# Altium footprint library Library.PcbLib: 224 footprints (part 9 of 16)
Each footprint in its own frame and in the unit in brackets; x right, y up, seen from the top. Pads: shape width x height; smd on the part's side, far side on the other; paste and mask are expansions set on the pad; w line width, h text height; cw(c..) or ccw(c..) is an arc to the next point about the centre after c.
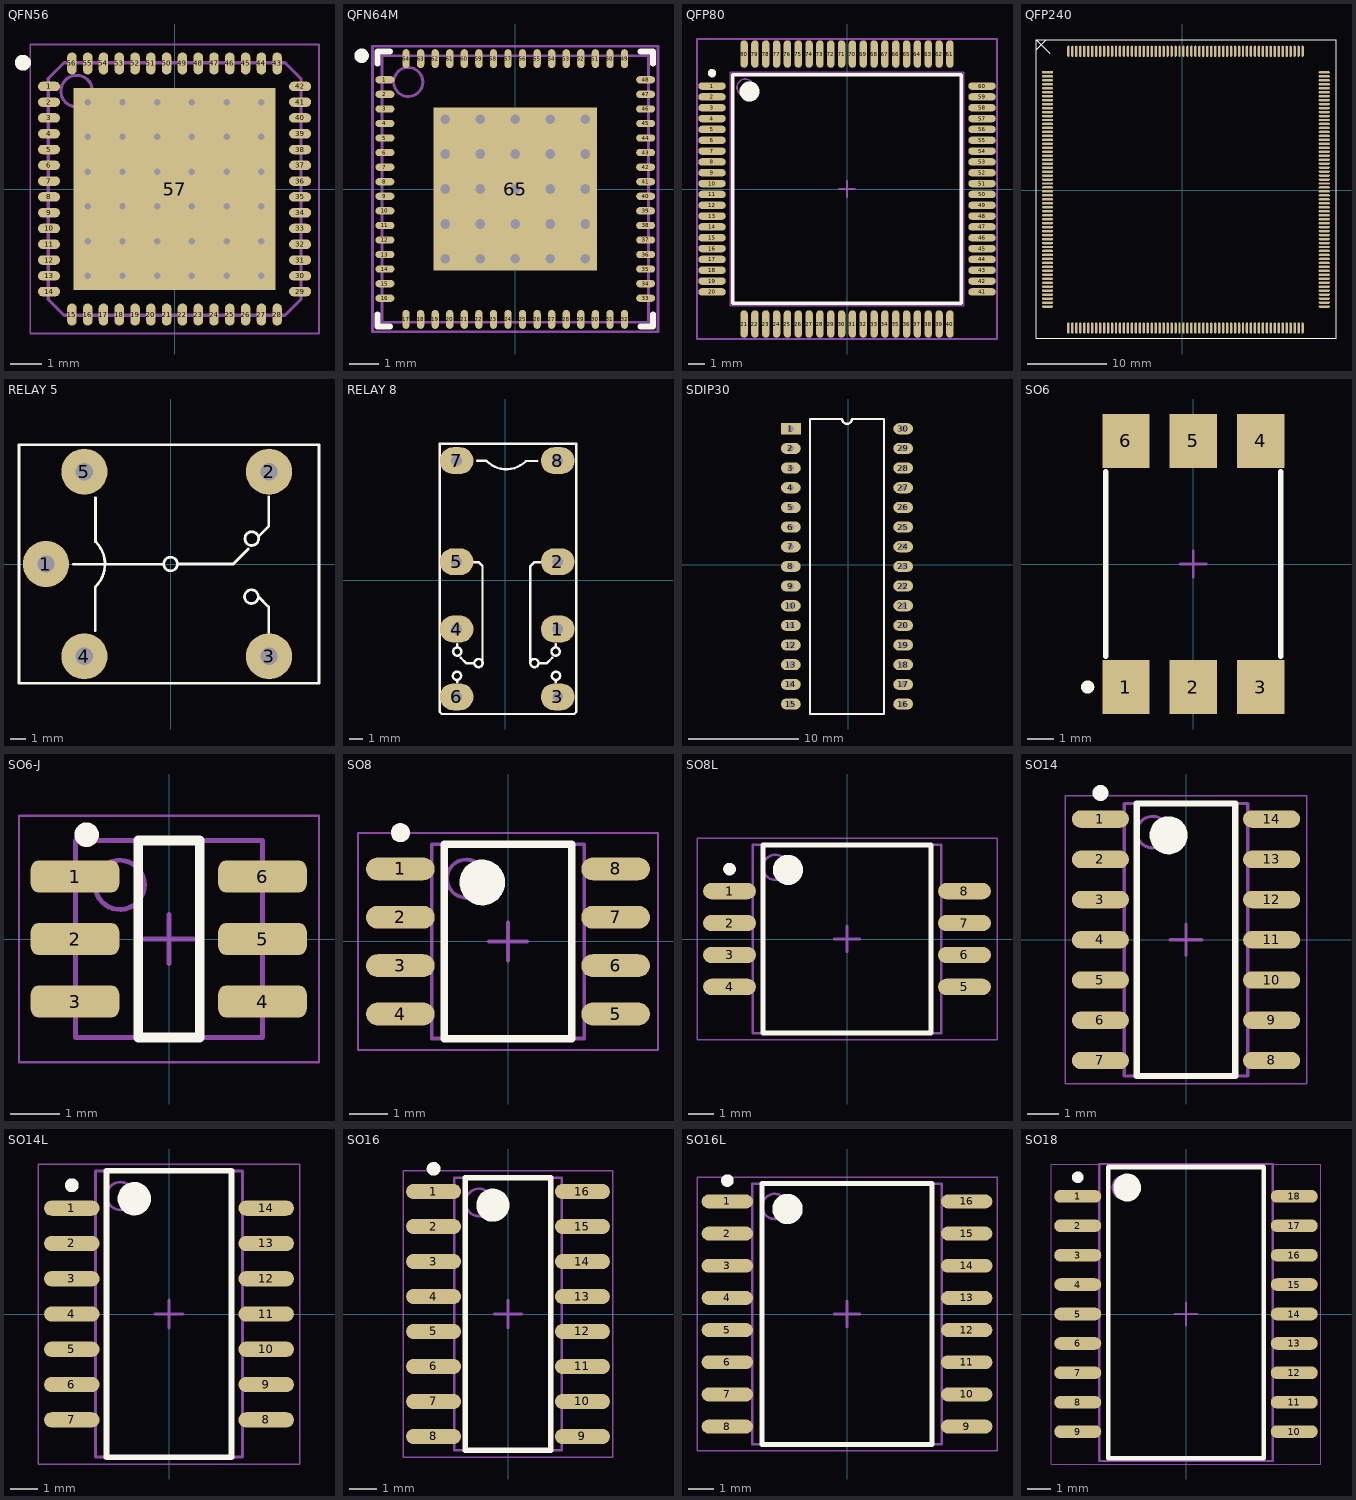
[diagram p8: the footprints below, top view; thin cyan lines are the x and y axes]

## QFN56 [mm] "QFN, 56-Leads, Body 8.00x8.00mm, Pitch 0.50mm, Thermal Pad 6.40x6.40mm, IPC Medium Density"
height 1
pads (57):
  oval 0.7x0.3 smd: 1(-3.975,3.25) 2(-3.975,2.75) 3(-3.975,2.25) 4(-3.975,1.75) 5(-3.975,1.25) 6(-3.975,0.75) 7(-3.975,0.25) 8(-3.975,-0.25) 9(-3.975,-0.75) 10(-3.975,-1.25) 11(-3.975,-1.75) 12(-3.975,-2.25) 13(-3.975,-2.75) 14(-3.975,-3.25) 29(3.975,-3.25) 30(3.975,-2.75) 31(3.975,-2.25) 32(3.975,-1.75) 33(3.975,-1.25) 34(3.975,-0.75) 35(3.975,-0.25) 36(3.975,0.25) 37(3.975,0.75) 38(3.975,1.25) 39(3.975,1.75) 40(3.975,2.25) 41(3.975,2.75) 42(3.975,3.25)
  oval 0.3x0.7 smd: 15(-3.25,-3.975) 16(-2.75,-3.975) 17(-2.25,-3.975) 18(-1.75,-3.975) 19(-1.25,-3.975) 20(-0.75,-3.975) 21(-0.25,-3.975) 22(0.25,-3.975) 23(0.75,-3.975) 24(1.25,-3.975) 25(1.75,-3.975) 26(2.25,-3.975) 27(2.75,-3.975) 28(3.25,-3.975) 43(3.25,3.975) 44(2.75,3.975) 45(2.25,3.975) 46(1.75,3.975) 47(1.25,3.975) 48(0.75,3.975) 49(0.25,3.975) 50(-0.25,3.975) 51(-0.75,3.975) 52(-1.25,3.975) 53(-1.75,3.975) 54(-2.25,3.975) 55(-2.75,3.975) 56(-3.25,3.975)
  rect 6.4x6.4 smd: 57(0,0)
via 2.75,-2.75 diameter 0.5 hole 0.2
via 1.65,-2.75 diameter 0.5 hole 0.2
via 0.55,-2.75 diameter 0.5 hole 0.2
via -0.55,-2.75 diameter 0.5 hole 0.2
via -1.65,-2.75 diameter 0.5 hole 0.2
via -2.75,-2.75 diameter 0.5 hole 0.2
via 2.75,-1.65 diameter 0.5 hole 0.2
via 1.65,-1.65 diameter 0.5 hole 0.2
via 0.55,-1.65 diameter 0.5 hole 0.2
via -0.55,-1.65 diameter 0.5 hole 0.2
via -1.65,-1.65 diameter 0.5 hole 0.2
via -2.75,-1.65 diameter 0.5 hole 0.2
via 2.75,-0.55 diameter 0.5 hole 0.2
via 1.65,-0.55 diameter 0.5 hole 0.2
via 0.55,-0.55 diameter 0.5 hole 0.2
via -0.55,-0.55 diameter 0.5 hole 0.2
via -1.65,-0.55 diameter 0.5 hole 0.2
via -2.75,-0.55 diameter 0.5 hole 0.2
via 2.75,0.55 diameter 0.5 hole 0.2
via 1.65,0.55 diameter 0.5 hole 0.2
via 0.55,0.55 diameter 0.5 hole 0.2
via -0.55,0.55 diameter 0.5 hole 0.2
via -1.65,0.55 diameter 0.5 hole 0.2
via -2.75,0.55 diameter 0.5 hole 0.2
via 2.75,1.65 diameter 0.5 hole 0.2
via 1.65,1.65 diameter 0.5 hole 0.2
via 0.55,1.65 diameter 0.5 hole 0.2
via -0.55,1.65 diameter 0.5 hole 0.2
via -1.65,1.65 diameter 0.5 hole 0.2
via -2.75,1.65 diameter 0.5 hole 0.2
via 2.75,2.75 diameter 0.5 hole 0.2
via 1.65,2.75 diameter 0.5 hole 0.2
via 0.55,2.75 diameter 0.5 hole 0.2
via -0.55,2.75 diameter 0.5 hole 0.2
via -1.65,2.75 diameter 0.5 hole 0.2
via -2.75,2.75 diameter 0.5 hole 0.2
Top Overlay:
  circle w0.25: c-4.8,4 r0.125
Mechanical 13:
  circle w0.1: c-3.1,3.1 r0.5
  lines w0.1: -4,-3.5 -4,3.5 -3.5,4 3.5,4 4,3.5 4,-3.5 3.5,-4 -3.5,-4 -4,-3.5
Mechanical 15:
  lines w0.05: -4.575,-4.575 4.575,-4.575 4.575,4.575 -4.575,4.575 -4.575,-4.575
  lines w0.1: -0.5,0 0.5,0 ; 0,-0.5 0,0.5
3D body "User Library-QFN56 (8x8).step": height 0.95, standoff 0, extent -4.015,-4.015 4.015,4.015

## QFN64M [mm] "QFN, 64-Leads, Body 9x9mm, Pitch 0.5mm, IPC High Density"
height 1
pads (65):
  oval 0.65x0.25 smd: 1(-4.475,3.75) 2(-4.475,3.25) 3(-4.475,2.75) 4(-4.475,2.25) 5(-4.475,1.75) 6(-4.475,1.25) 7(-4.475,0.75) 8(-4.475,0.25) 9(-4.475,-0.25) 10(-4.475,-0.75) 11(-4.475,-1.25) 12(-4.475,-1.75) 13(-4.475,-2.25) 14(-4.475,-2.75) 15(-4.475,-3.25) 16(-4.475,-3.75) 33(4.475,-3.75) 34(4.475,-3.25) 35(4.475,-2.75) 36(4.475,-2.25) 37(4.475,-1.75) 38(4.475,-1.25) 39(4.475,-0.75) 40(4.475,-0.25) 41(4.475,0.25) 42(4.475,0.75) 43(4.475,1.25) 44(4.475,1.75) 45(4.475,2.25) 46(4.475,2.75) 47(4.475,3.25) 48(4.475,3.75)
  oval 0.25x0.65 smd: 17(-3.75,-4.475) 18(-3.25,-4.475) 19(-2.75,-4.475) 20(-2.25,-4.475) 21(-1.75,-4.475) 22(-1.25,-4.475) 23(-0.75,-4.475) 24(-0.25,-4.475) 25(0.25,-4.475) 26(0.75,-4.475) 27(1.25,-4.475) 28(1.75,-4.475) 29(2.25,-4.475) 30(2.75,-4.475) 31(3.25,-4.475) 32(3.75,-4.475) 49(3.75,4.475) 50(3.25,4.475) 51(2.75,4.475) 52(2.25,4.475) 53(1.75,4.475) 54(1.25,4.475) 55(0.75,4.475) 56(0.25,4.475) 57(-0.25,4.475) 58(-0.75,4.475) 59(-1.25,4.475) 60(-1.75,4.475) 61(-2.25,4.475) 62(-2.75,4.475) 63(-3.25,4.475) 64(-3.75,4.475)
  rect 5.6x5.6 smd: 65(0,0)
via -2.4,2.4 diameter 0.66 hole 0.33
via -1.2,2.4 diameter 0.66 hole 0.33
via 0,2.4 diameter 0.66 hole 0.33
via 1.2,2.4 diameter 0.66 hole 0.33
via 2.4,2.4 diameter 0.66 hole 0.33
via -2.4,1.2 diameter 0.66 hole 0.33
via -1.2,1.2 diameter 0.66 hole 0.33
via 0,1.2 diameter 0.66 hole 0.33
via 1.2,1.2 diameter 0.66 hole 0.33
via 2.4,1.2 diameter 0.66 hole 0.33
via -2.4,0 diameter 0.66 hole 0.33
via -1.2,0 diameter 0.66 hole 0.33
via 0,0 diameter 0.66 hole 0.33
via 1.2,0 diameter 0.66 hole 0.33
via 2.4,0 diameter 0.66 hole 0.33
via -2.4,-1.2 diameter 0.66 hole 0.33
via -1.2,-1.2 diameter 0.66 hole 0.33
via 0,-1.2 diameter 0.66 hole 0.33
via 1.2,-1.2 diameter 0.66 hole 0.33
via 2.4,-1.2 diameter 0.66 hole 0.33
via -2.4,-2.4 diameter 0.66 hole 0.33
via -1.2,-2.4 diameter 0.66 hole 0.33
via 0,-2.4 diameter 0.66 hole 0.33
via 1.2,-2.4 diameter 0.66 hole 0.33
via 2.4,-2.4 diameter 0.66 hole 0.33
Top Overlay:
  circle w0.25: c-5.275,4.575 r0.125
  lines w0.2: -4.725,-4.3 -4.725,-4.725 -4.3,-4.725 ; -4.725,4.3 -4.725,4.725 -4.3,4.725 ; 4.3,-4.725 4.725,-4.725 4.725,-4.3 ; 4.3,4.725 4.725,4.725 4.725,4.3
Mechanical 13:
  circle w0.1: c-3.675,3.675 r0.5
  lines w0.1: -4.575,-4.575 -4.575,4.575 4.575,4.575 4.575,-4.575 -4.575,-4.575
Mechanical 15:
  lines w0.1: -0.5,0 0.5,0 ; 0,-0.5 0,0.5 ; -4.9,-4.9 -4.9,4.9 4.9,4.9 4.9,-4.9 -4.9,-4.9
3D body "User Library-SiLabs QFN64 (9x9).step": height 0.9, standoff 0, extent -4.5,-4.5 4.5,4.5

## QFP80 [mm] "QFP, 80-Leads, Body 14 x 14mm, Pitch 0.65mm, IPC High Density"
height 2.45
pads (80):
  oval 1.65x0.45 smd: 1(-8.1,6.175) 2(-8.1,5.525) 3(-8.1,4.875) 4(-8.1,4.225) 5(-8.1,3.575) 6(-8.1,2.925) 7(-8.1,2.275) 8(-8.1,1.625) 9(-8.1,0.975) 10(-8.1,0.325) 11(-8.1,-0.325) 12(-8.1,-0.975) 13(-8.1,-1.625) 14(-8.1,-2.275) 15(-8.1,-2.925) 16(-8.1,-3.575) 17(-8.1,-4.225) 18(-8.1,-4.875) 19(-8.1,-5.525) 20(-8.1,-6.175) 41(8.1,-6.175) 42(8.1,-5.525) 43(8.1,-4.875) 44(8.1,-4.225) 45(8.1,-3.575) 46(8.1,-2.925) 47(8.1,-2.275) 48(8.1,-1.625) 49(8.1,-0.975) 50(8.1,-0.325) 51(8.1,0.325) 52(8.1,0.975) 53(8.1,1.625) 54(8.1,2.275) 55(8.1,2.925) 56(8.1,3.575) 57(8.1,4.225) 58(8.1,4.875) 59(8.1,5.525) 60(8.1,6.175)
  oval 0.45x1.65 smd: 21(-6.175,-8.1) 22(-5.525,-8.1) 23(-4.875,-8.1) 24(-4.225,-8.1) 25(-3.575,-8.1) 26(-2.925,-8.1) 27(-2.275,-8.1) 28(-1.625,-8.1) 29(-0.975,-8.1) 30(-0.325,-8.1) 31(0.325,-8.1) 32(0.975,-8.1) 33(1.625,-8.1) 34(2.275,-8.1) 35(2.925,-8.1) 36(3.575,-8.1) 37(4.225,-8.1) 38(4.875,-8.1) 39(5.525,-8.1) 40(6.175,-8.1) 61(6.175,8.1) 62(5.525,8.1) 63(4.875,8.1) 64(4.225,8.1) 65(3.575,8.1) 66(2.925,8.1) 67(2.275,8.1) 68(1.625,8.1) 69(0.975,8.1) 70(0.325,8.1) 71(-0.325,8.1) 72(-0.975,8.1) 73(-1.625,8.1) 74(-2.275,8.1) 75(-2.925,8.1) 76(-3.575,8.1) 77(-4.225,8.1) 78(-4.875,8.1) 79(-5.525,8.1) 80(-6.175,8.1)
Top Overlay:
  circle w0.25: c-8.1,6.95 r0.125
  circle w0.6: c-5.85,5.85 r0.3
  lines w0.2: -6.85,-6.85 -6.85,6.85 6.85,6.85 6.85,-6.85 -6.85,-6.85
Mechanical 13:
  circle w0.1: c-6.1,6.1 r0.5
  lines w0.1: -7,-7 -7,7 7,7 7,-7 -7,-7
Mechanical 15:
  lines w0.1: -0.5,0 0.5,0 ; 0,-0.5 0,0.5 ; -9,-9 -9,9 9,9 9,-9 -9,-9
3D body "User Library-IPC QFP-full.step": height 1.35, standoff 0, extent -8.018,-8.018 8.018,8.018

## QFP240 [mm]
pads (240):
  rect 1.4x0.31 smd: 1(-16.993,14.859)
  oval 1.4x0.31 smd: 2(-16.993,14.359) 3(-16.993,13.859) 4(-16.993,13.359) 5(-16.993,12.859) 6(-16.993,12.359) 7(-16.993,11.859) 8(-16.993,11.359) 9(-16.993,10.859) 10(-16.993,10.359) 11(-16.993,9.859) 12(-16.993,9.359) 13(-16.993,8.859) 14(-16.993,8.359) 15(-16.993,7.859) 16(-16.993,7.359) 17(-16.993,6.859) 18(-16.993,6.359) 19(-16.993,5.859) 20(-16.993,5.359) 21(-16.993,4.859) 22(-16.993,4.359) 23(-16.993,3.859) 24(-16.993,3.359) 25(-16.993,2.859) 26(-16.993,2.359) 27(-16.993,1.859) 28(-16.993,1.359) 29(-16.993,0.859) 30(-16.993,0.359) 31(-16.993,-0.141) 32(-16.993,-0.641) 33(-16.993,-1.141) 34(-16.993,-1.641) 35(-16.993,-2.141) 36(-16.993,-2.641) 37(-16.993,-3.141) 38(-16.993,-3.641) 39(-16.993,-4.141) 40(-16.993,-4.641) 41(-16.993,-5.141) 42(-16.993,-5.641) 43(-16.993,-6.141) 44(-16.993,-6.641) 45(-16.993,-7.141) 46(-16.993,-7.641) 47(-16.993,-8.141) 48(-16.993,-8.641) 49(-16.993,-9.141) 50(-16.993,-9.641) 51(-16.993,-10.141) 52(-16.993,-10.641) 53(-16.993,-11.141) 54(-16.993,-11.641) 55(-16.993,-12.141) 56(-16.993,-12.641) 57(-16.993,-13.141) 58(-16.993,-13.641) 59(-16.993,-14.141) 60(-16.993,-14.641) 121(17.872,-14.641) 122(17.872,-14.141) 123(17.872,-13.641) 124(17.872,-13.141) 125(17.872,-12.641) 126(17.872,-12.141) 127(17.872,-11.641) 128(17.872,-11.141) 129(17.872,-10.641) 130(17.872,-10.141) 131(17.872,-9.641) 132(17.872,-9.141) 133(17.872,-8.641) 134(17.872,-8.141) 135(17.872,-7.641) 136(17.872,-7.141) 137(17.872,-6.641) 138(17.872,-6.141) 139(17.872,-5.641) 140(17.872,-5.141) 141(17.872,-4.641) 142(17.872,-4.141) 143(17.872,-3.641) 144(17.872,-3.141) 145(17.872,-2.641) 146(17.872,-2.141) 147(17.872,-1.641) 148(17.872,-1.141) 149(17.872,-0.641) 150(17.872,-0.141) 151(17.872,0.359) 152(17.872,0.859) 153(17.872,1.359) 154(17.872,1.859) 155(17.872,2.359) 156(17.872,2.859) 157(17.872,3.359) 158(17.872,3.859) 159(17.872,4.359) 160(17.872,4.859) 161(17.872,5.359) 162(17.872,5.859) 163(17.872,6.359) 164(17.872,6.859) 165(17.872,7.359) 166(17.872,7.859) 167(17.872,8.359) 168(17.872,8.859) 169(17.872,9.359) 170(17.872,9.859) 171(17.872,10.359) 172(17.872,10.859) 173(17.872,11.359) 174(17.872,11.859) 175(17.872,12.359) 176(17.872,12.859) 177(17.872,13.359) 178(17.872,13.859) 179(17.872,14.359) 180(17.872,14.859)
  oval 0.31x1.4 smd: 61(-14.361,-17.349) 62(-13.861,-17.349) 63(-13.361,-17.349) 64(-12.861,-17.349) 65(-12.361,-17.349) 66(-11.861,-17.349) 67(-11.361,-17.349) 68(-10.861,-17.349) 69(-10.361,-17.349) 70(-9.861,-17.349) 71(-9.361,-17.349) 72(-8.861,-17.349) 73(-8.361,-17.349) 74(-7.861,-17.349) 75(-7.361,-17.349) 76(-6.861,-17.349) 77(-6.361,-17.349) 78(-5.861,-17.349) 79(-5.361,-17.349) 80(-4.861,-17.349) 81(-4.361,-17.349) 82(-3.861,-17.349) 83(-3.361,-17.349) 84(-2.861,-17.349) 85(-2.361,-17.349) 86(-1.861,-17.349) 87(-1.361,-17.349) 88(-0.861,-17.349) 89(-0.361,-17.349) 90(0.139,-17.349) 91(0.639,-17.349) 92(1.139,-17.349) 93(1.639,-17.349) 94(2.139,-17.349) 95(2.639,-17.349) 96(3.139,-17.349) 97(3.639,-17.349) 98(4.139,-17.349) 99(4.639,-17.349) 100(5.139,-17.349) 101(5.639,-17.349) 102(6.139,-17.349) 103(6.639,-17.349) 104(7.139,-17.349) 105(7.639,-17.349) 106(8.139,-17.349) 107(8.639,-17.349) 108(9.139,-17.349) 109(9.639,-17.349) 110(10.139,-17.349) 111(10.639,-17.349) 112(11.139,-17.349) 113(11.639,-17.349) 114(12.139,-17.349) 115(12.639,-17.349) 116(13.139,-17.349) 117(13.639,-17.349) 118(14.139,-17.349) 119(14.639,-17.349) 120(15.139,-17.349) 181(15.139,17.516) 182(14.639,17.516) 183(14.139,17.516) 184(13.639,17.516) 185(13.139,17.516) 186(12.639,17.516) 187(12.139,17.516) 188(11.639,17.516) 189(11.139,17.516) 190(10.639,17.516) 191(10.139,17.516) 192(9.639,17.516) 193(9.139,17.516) 194(8.639,17.516) 195(8.139,17.516) 196(7.639,17.516) 197(7.139,17.516) 198(6.639,17.516) 199(6.139,17.516) 200(5.639,17.516) 201(5.139,17.516) 202(4.639,17.516) 203(4.139,17.516) 204(3.639,17.516) 205(3.139,17.516) 206(2.639,17.516) 207(2.139,17.516) 208(1.639,17.516) 209(1.139,17.516) 210(0.639,17.516) 211(0.139,17.516) 212(-0.361,17.516) 213(-0.861,17.516) 214(-1.361,17.516) 215(-1.861,17.516) 216(-2.361,17.516) 217(-2.861,17.516) 218(-3.361,17.516) 219(-3.861,17.516) 220(-4.361,17.516) 221(-4.861,17.516) 222(-5.361,17.516) 223(-5.861,17.516) 224(-6.361,17.516) 225(-6.861,17.516) 226(-7.361,17.516) 227(-7.861,17.516) 228(-8.361,17.516) 229(-8.861,17.516) 230(-9.361,17.516) 231(-9.861,17.516) 232(-10.361,17.516) 233(-10.861,17.516) 234(-11.361,17.516) 235(-11.861,17.516) 236(-12.361,17.516) 237(-12.861,17.516) 238(-13.361,17.516) 239(-13.861,17.516) 240(-14.361,17.516)
Top Overlay:
  lines w0.127: -18.44,17.145 -18.44,17.678 -17.145,18.974 ; -16.739,17.272 -18.44,18.974 ; -18.44,18.974 -18.44,-18.644 19.355,-18.644 19.355,18.974 -18.44,18.974
3D body "User Library-QFP240.step": height 4, standoff 0, extent -16.891,-17.145 17.709,17.455

## RELAY 5 [mil] "Reley DPDT, 8 pin, 1A, W400mil, L800mil,H 300mil"
height 300
pads (5):
  round 120 hole 45: 1(-325,0) 2(255,240) 3(255,-240) 4(-225,-240) 5(-225,240)
Top Overlay:
  circle w7: c-0.8,0 r17.8
  circle w7: c210.2,66 r17.8
  circle w7: c209.2,-85 r17.8
  lines w7: -254,-1 -21,-1 ; -197,-173 -197,-60 ; -196,-59 ccw(c-253.5,-0.5) -195,57 ; -196,58 -196,172 ; 19,0 162,0 201,39 ; 227,-85 254,-112 254,-178 ; 228,72 254,98 254,174 ; -395,-310 385,-310 385,310 -395,310 -395,-310
3D body "User Library-SONGLE Relay SRU-12VDC-SL-C.step": height 602.36, standoff -196.85, extent -370.98,-304.24 380.98,306

## RELAY 8 [mil]
pads (8):
  oval 100x80 hole 32: 1(155,-145) 2(155,55) 3(155,-346) 4(-145,-145) 5(-145,55) 6(-145,-346) 7(-145,355) 8(155,355)
Top Overlay:
  circle w7: c-144,-283.76 r12.24
  circle w7: c-143,-211.76 r12.24
  circle w7: c-80,-245.76 r12.24
  circle w7: c86,-245.76 r12.24
  circle w7: c149,-211.76 r12.24
  circle w7: c150,-283.76 r12.24
  lines w7: -143,-303 -143,-298 ; -143,-197 -143,-189 ; -133,-230 -117,-246 -94,-246 ; -100,53 -79,53 -68,42 -68,-244 ; -84,355 -57,355 ; -56,354 ccw(c2.5,411.5) 60,353 ; 61,354 94,354 ; 74,-244 74,42 85,53 113,53 ; 100,-246 123,-246 139,-230 ; 149,-303 149,-298 ; 149,-197 149,-189 ; -195,-391 -195,405 210,405 210,-391 204,-397 -189,-397 -195,-391
3D body "SW3dPS-DSY2Y.STEP": height 484.25, standoff -118.11, extent -185,-404.45 200.83,414.45

## SDIP30 [mm]
pads (30):
  rect 1.8x1 hole 0.6: 1(-5.207,12.319)
  oval 1.8x1 hole 0.6: 2(-5.207,10.541) 3(-5.207,8.763) 4(-5.207,6.985) 5(-5.207,5.207) 6(-5.207,3.429) 7(-5.207,1.651) 8(-5.207,-0.127) 9(-5.207,-1.905) 10(-5.207,-3.683) 11(-5.207,-5.461) 12(-5.207,-7.239) 13(-5.207,-9.017) 14(-5.207,-10.795) 15(-5.207,-12.573) 16(4.953,-12.573) 17(4.953,-10.795) 18(4.953,-9.017) 19(4.953,-7.239) 20(4.953,-5.461) 21(4.953,-3.683) 22(4.953,-1.905) 23(4.953,-0.127) 24(4.953,1.651) 25(4.953,3.429) 26(4.953,5.207) 27(4.953,6.985) 28(4.953,8.763) 29(4.953,10.541) 30(4.953,12.319)
Top Overlay:
  lines w0.2: -3.472,-13.462 3.218,-13.462 3.218,13.208 0.318,13.208 cw(c-0.127,13.208) -0.572,13.208 -3.472,13.208 -3.472,-13.462
3D body "User Library-ul7aajr_sdip30.STEP": height 4.2, standoff -3.26, extent -5.34,-14.097 5.08,13.843

## SO6 [mil]
height 200
pads (6):
  rect 70x80 smd: 1(-100,-182.48) 2(0,-182.48) 3(100,-182.48) 5(0,182.48) 6(-100,182.48)
  rect 70x80 smd mask+0: 4(100,182.48)
Top Overlay:
  circle w9.84: c-156.69,-182.48 r4.92
  lines w7.87: -129.92,-136.81 -129.92,136.81 ; 129.92,-136.81 129.92,136.81
Mechanical 15:
  lines w3.94: -19.69,0 19.68,0 ; 0,-19.68 0,19.68
3D body "PC900.stp": height 140.63, standoff 0.14, extent -138.06,-212.03 138.5,211.43

## SO6-J [mm] "SOJ, 6-Leads, Body 4.00x4.30mm, Pitch 1.27mm, IPC Low Density"
height 1.1
pads (6):
  rrect50% 1.8x0.65 smd: 1(-1.91,1.27) 2(-1.91,0) 3(-1.91,-1.27) 4(1.9,-1.27) 5(1.9,0) 6(1.9,1.27)
Top Overlay:
  circle w0.25: c-1.675,2.12 r0.125
  lines w0.2: -0.625,-2 -0.625,2 0.625,2 0.625,-2 -0.625,-2
Mechanical 13:
  circle w0.1: c-1,1.1 r0.5
  lines w0.1: -1.9,-2 -1.9,2 1.9,2 1.9,-2 -1.9,-2
Mechanical 15:
  lines w0.05: -3.048,-2.5 -3.048,2.5 3.048,2.5 3.048,-2.5 -3.048,-2.5
  lines w0.1: -0.5,0 0.5,0 ; 0,-0.5 0,0.5
3D body "SOIC127P490X150-6N.step": height 1.5, standoff 0, extent -2.45,-2 2.45,2

## SO8 [mm] "SOIC, 8-Leads, Body 4.9x3.9mm, Pitch 1.27mm, IPC High Density"
pads (8):
  oval 1.8x0.6 smd: 1(-2.825,1.905) 2(-2.825,0.635) 3(-2.825,-0.635) 4(-2.825,-1.905) 5(2.825,-1.905) 6(2.825,-0.635) 7(2.825,0.635) 8(2.825,1.905)
Top Overlay:
  circle w0.25: c-2.825,2.855 r0.125
  circle w0.6: c-0.675,1.55 r0.3
  lines w0.2: -1.675,-2.55 -1.675,2.55 1.675,2.55 1.675,-2.55 -1.675,-2.55
Mechanical 13:
  circle w0.1: c-1.1,1.65 r0.5
  lines w0.1: -2,-2.55 -2,2.55 2,2.55 2,-2.55 -2,-2.55
Mechanical 15:
  lines w0.05: -3.937,-2.85 -3.937,2.85 3.937,2.85 3.937,-2.85 -3.937,-2.85
  lines w0.1: -0.5,0 0.5,0 ; 0,-0.5 0,0.5
3D body "CircuitWorks-SO-8 (PIC12FXXX).step": height 1.6, standoff 0, extent -2.995,-2.45 2.995,2.45

## SO8L [mm] "SOIC, 8-Leads, Body 7.50x7.50mm, Pitch 1.27mm, IPC Medium Density"
height 1.5
pads (8):
  oval 2.1x0.65 smd: 1(-4.675,1.905) 2(-4.675,0.635) 3(-4.675,-0.635) 4(-4.675,-1.905) 5(4.675,-1.905) 6(4.675,-0.635) 7(4.675,0.635) 8(4.675,1.905)
Top Overlay:
  circle w0.25: c-4.675,2.78 r0.125
  circle w0.6: c-2.35,2.75 r0.3
  lines w0.2: -3.35,-3.75 -3.35,3.75 3.35,3.75 3.35,-3.75 -3.35,-3.75
Mechanical 13:
  circle w0.1: c-2.85,2.85 r0.5
  lines w0.1: -3.75,-3.75 -3.75,3.75 3.75,3.75 3.75,-3.75 -3.75,-3.75
Mechanical 15:
  lines w0.05: -5.969,-4 -5.969,4 5.969,4 5.969,-4 -5.969,-4
  lines w0.1: -0.5,0 0.5,0 ; 0,-0.5 0,0.5
3D body "SOIC127P1000X150-8N.step": height 1.5, standoff 0, extent -5,-3.65 5,3.65

## SO14 [mm] "SOIC, 14-Leads, Body 8.60x3.90mm, Pitch 1.27mm, IPC Medium Density"
height 1.75
pads (14):
  oval 1.8x0.55 smd: 1(-2.7,3.81) 2(-2.7,2.54) 3(-2.7,1.27) 4(-2.7,0) 5(-2.7,-1.27) 6(-2.7,-2.54) 7(-2.7,-3.81) 8(2.7,-3.81) 9(2.7,-2.54) 10(2.7,-1.27) 11(2.7,0) 12(2.7,1.27) 13(2.7,2.54) 14(2.7,3.81)
Top Overlay:
  circle w0.25: c-2.7,4.635 r0.125
  circle w0.6: c-0.55,3.3 r0.3
  lines w0.2: -1.55,-4.3 -1.55,4.3 1.55,4.3 1.55,-4.3 -1.55,-4.3
Mechanical 13:
  circle w0.1: c-1.05,3.4 r0.5
  lines w0.1: -1.95,-4.3 -1.95,4.3 1.95,4.3 1.95,-4.3 -1.95,-4.3
Mechanical 15:
  lines w0.05: -3.81,-4.55 -3.81,4.55 3.81,4.55 3.81,-4.55 -3.81,-4.55
  lines w0.1: -0.5,0 0.5,0 ; 0,-0.5 0,0.5
3D body "SOIC127P600X175-14N.step": height 1.75, standoff 0, extent -2.873,-4.3 3.127,4.3

## SO14L [mm] "SOIC, 14-Leads, Body 10.30x5.30mm, Pitch 1.27mm, IPC Medium Density"
height 2
pads (14):
  oval 2x0.55 smd: 1(-3.5,3.81) 2(-3.5,2.54) 3(-3.5,1.27) 4(-3.5,0) 5(-3.5,-1.27) 6(-3.5,-2.54) 7(-3.5,-3.81) 8(3.5,-3.81) 9(3.5,-2.54) 10(3.5,-1.27) 11(3.5,0) 12(3.5,1.27) 13(3.5,2.54) 14(3.5,3.81)
Top Overlay:
  circle w0.25: c-3.5,4.635 r0.125
  circle w0.6: c-1.25,4.15 r0.3
  lines w0.2: -2.25,-5.15 -2.25,5.15 2.25,5.15 2.25,-5.15 -2.25,-5.15
Mechanical 13:
  circle w0.1: c-1.75,4.25 r0.5
  lines w0.1: -2.65,-5.15 -2.65,5.15 2.65,5.15 2.65,-5.15 -2.65,-5.15
Mechanical 15:
  lines w0.05: -4.699,-5.4 -4.699,5.4 4.699,5.4 4.699,-5.4 -4.699,-5.4
  lines w0.1: -0.5,0 0.5,0 ; 0,-0.5 0,0.5
3D body "SOIC127P760X150-14N.step": height 1.5, standoff 0, extent -3.81,-5.15 3.81,5.15

## SO16 [mm] "SOIC, 16-Leads, Body 9.90x3.91mm, Pitch 1.27mm, IPC Medium Density"
height 1.75
pads (16):
  oval 2x0.55 smd: 1(-2.7,4.445) 2(-2.7,3.175) 3(-2.7,1.905) 4(-2.7,0.635) 5(-2.7,-0.635) 6(-2.7,-1.905) 7(-2.7,-3.175) 8(-2.7,-4.445) 9(2.7,-4.445) 10(2.7,-3.175) 11(2.7,-1.905) 12(2.7,-0.635) 13(2.7,0.635) 14(2.7,1.905) 15(2.7,3.175) 16(2.7,4.445)
Top Overlay:
  circle w0.25: c-2.7,5.27 r0.125
  circle w0.6: c-0.55,3.95 r0.3
  lines w0.2: -1.55,-4.95 -1.55,4.95 1.55,4.95 1.55,-4.95 -1.55,-4.95
Mechanical 13:
  circle w0.1: c-1.05,4.05 r0.5
  lines w0.1: -1.95,-4.95 -1.95,4.95 1.95,4.95 1.95,-4.95 -1.95,-4.95
Mechanical 15:
  lines w0.05: -3.81,-5.2 -3.81,5.2 3.81,5.2 3.81,-5.2 -3.81,-5.2
  lines w0.1: -0.5,0 0.5,0 ; 0,-0.5 0,0.5
3D body "User Library-SOIC-16-1.step": height 1.4, standoff 0, extent -3,-4.95 3,4.95

## SO16L [mm] "SOIC, 16-Leads, Body 10.30x7.50mm, Pitch 1.27mm, IPC Medium Density"
height 2.4
pads (16):
  oval 2.032x0.55 smd: 1(-4.725,4.445) 2(-4.725,3.175) 3(-4.725,1.905) 4(-4.725,0.635) 5(-4.725,-0.635) 6(-4.725,-1.905) 7(-4.725,-3.175) 8(-4.725,-4.445) 9(4.725,-4.445) 10(4.725,-3.175) 11(4.725,-1.905) 12(4.725,-0.635) 13(4.725,0.635) 14(4.725,1.905) 15(4.725,3.175) 16(4.725,4.445)
Top Overlay:
  circle w0.6: c-2.35,4.15 r0.3
  circle w0.25: c-4.725,5.27 r0.125
  lines w0.2: -3.35,-5.15 3.35,-5.15 3.35,5.15 -3.35,5.15 -3.35,-5.15
Mechanical 13:
  circle w0.1: c-2.85,4.25 r0.5
  lines w0.1: -3.75,-5.15 3.75,-5.15 3.75,5.15 -3.75,5.15 -3.75,-5.15
Mechanical 15:
  lines w0.05: -5.925,-5.4 5.925,-5.4 5.925,5.4 -5.925,5.4 -5.925,-5.4
  lines w0.1: -0.5,0 0.5,0 ; 0,-0.5 0,0.5
3D body "User Library-SO-16W.STEP": height 2.48, standoff 0, extent -5.155,-5.165 5.155,5.165

## SO18 [mm] "SOIC, 18-Leads, Body 11.50x7.50mm, Pitch 1.27mm, IPC Medium Density"
height 2.3
pads (18):
  oval 2.032x0.55 smd: 1(-4.675,5.08) 2(-4.675,3.81) 3(-4.675,2.54) 4(-4.675,1.27) 5(-4.675,0) 6(-4.675,-1.27) 7(-4.675,-2.54) 8(-4.675,-3.81) 9(-4.675,-5.08) 10(4.675,-5.08) 11(4.675,-3.81) 12(4.675,-2.54) 13(4.675,-1.27) 14(4.675,0) 15(4.675,1.27) 16(4.675,2.54) 17(4.675,3.81) 18(4.675,5.08)
Top Overlay:
  circle w0.25: c-4.675,5.905 r0.125
  circle w0.6: c-2.54,5.461 r0.3
  lines w0.2: -3.35,-6.223 -3.35,6.35 3.35,6.35 3.35,-6.223 -3.35,-6.223
Mechanical 13:
  circle w0.1: c-2.667,5.461 r0.5
  lines w0.1: -3.75,-6.35 -3.75,6.477 3.75,6.477 3.75,-6.35 -3.75,-6.35
Mechanical 15:
  lines w0.05: -5.825,-6.477 -5.825,6.477 5.825,6.477 5.825,-6.477 -5.825,-6.477
  lines w0.1: -0.5,0 0.5,0 ; 0,-0.5 0,0.5
3D body "User Library-SOIC18-300.step": height 2.7, standoff 0.05, extent -5.15,-5.765 5.15,5.765